# Altium footprint library WE Inductors.PcbLib: 131 footprints (part 1 of 9)
Each footprint in its own frame and in the unit in brackets; x right, y up, seen from the top. Pads: shape width x height; smd on the part's side, far side on the other; paste and mask are expansions set on the pad; w line width, h text height; cw(c..) or ccw(c..) is an arc to the next point about the centre after c.
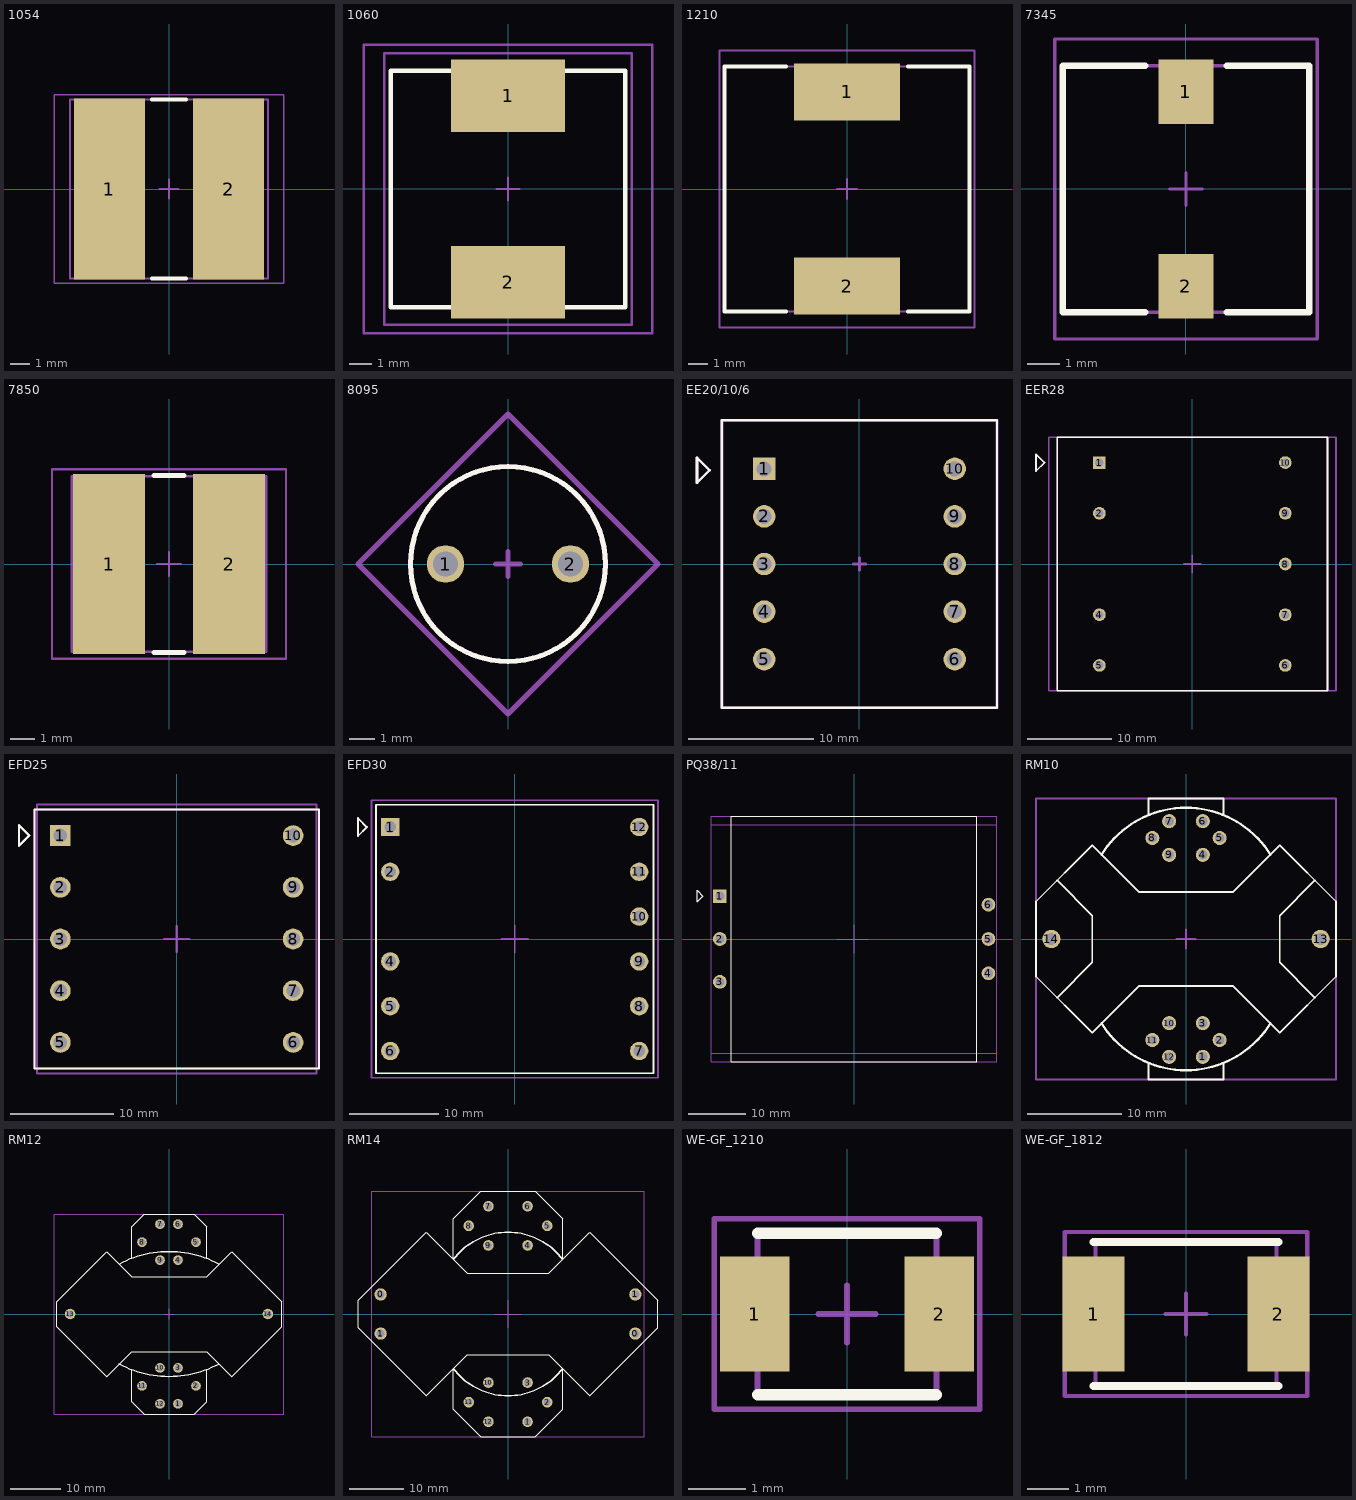
[diagram p0: the footprints below, top view; thin cyan lines are the x and y axes]

## 1054 [mm] "Precision Wire Wound Inductor, 2-Leads, Body 10.0x9.0mm, IPC Medium Density"
height 5.9
pads (2):
  rect 3.75x9.5 smd: 1(-3.125,0) 2(3.125,0)
Top Overlay:
  lines w0.2: -0.9,-4.7 0.9,-4.7 ; -0.9,4.7 0.9,4.7
Top Solder:
  rectangle: -1.27,-4.953 1.27,4.953
Mechanical 13:
  lines w0.1: -5.2,-4.7 -5.2,4.7 5.2,4.7 5.2,-4.7 -5.2,-4.7
Mechanical 15:
  lines w0.1: -0.5,0 0.5,0 ; 0,-0.5 0,0.5 ; -6.025,-4.95 -6.025,4.95 6.025,4.95 6.025,-4.95 -6.025,-4.95
3D body: height 5.4, standoff 0, extent -4.931,-4.5 4.932,4.502

## 1060 [mm] "Precision Wire Wound Inductor, 2-Leads, Body 10.0x10.0mm, IPC Medium Density"
height 6
pads (2):
  rect 5x3.2 smd: 1(0,4.1) 2(0,-4.1)
Top Overlay:
  lines w0.2: -2.5,-5.2 -5.15,-5.2 -5.15,5.2 -2.5,5.2 ; 2.5,-5.2 5.15,-5.2 5.15,5.2 2.5,5.2
Mechanical 13:
  lines w0.1: -6.35,-6.35 6.35,-6.35 6.35,6.35 -6.35,6.35 -6.35,-6.35
Mechanical 15:
  lines w0.1: -0.5,0 0.5,0 ; 0,-0.5 0,0.5 ; -5.45,-5.975 5.45,-5.975 5.45,5.975 -5.45,5.975 -5.45,-5.975
3D body: height 5.65, standoff 0, extent -6,-6 6,6

## 1210 [mm] "Precision Wire Wound Inductor, 2-Leads, Body 12.0x12.0mm, IPC Medium Density"
height 10.5
pads (2):
  rect 5.4x2.9 smd: 1(0,4.95) 2(0,-4.95)
Top Overlay:
  lines w0.2: -3.1,-6.25 -6.25,-6.25 -6.25,6.25 -3.1,6.25 ; 3.1,-6.25 6.25,-6.25 6.25,6.25 3.1,6.25
Mechanical 13:
  lines w0.1: -6.25,-6.25 -6.25,6.25 6.25,6.25 6.25,-6.25 -6.25,-6.25
Mechanical 15:
  lines w0.1: -0.5,0 0.5,0 ; 0,-0.5 0,0.5 ; -6.5,-7.075 -6.5,7.075 6.5,7.075 6.5,-7.075 -6.5,-7.075
3D body: height 9.7, standoff 0, extent -6,-6 6,6

## 7345 [mm] "Precision Wire Wound Inductor, 2-Leads, Body 7.3x7.3mm, IPC Medium Density"
height 4.5
pads (2):
  rect 1.7x2 smd: 1(0,3) 2(0,-3)
Top Overlay:
  lines w0.2: -1.25,-3.8 -3.8,-3.8 -3.8,3.8 -1.25,3.8 ; 1.25,-3.8 3.8,-3.8 3.8,3.8 1.25,3.8
Mechanical 13:
  lines w0.1: -3.8,-3.8 -3.8,3.8 3.8,3.8 3.8,-3.8 -3.8,-3.8
Mechanical 15:
  lines w0.1: -0.5,0 0.5,0 ; 0,-0.5 0,0.5 ; -4.05,-4.625 -4.05,4.625 4.05,4.625 4.05,-4.625 -4.05,-4.625
3D body: height 4.05, standoff 0, extent -3.65,-3.65 3.65,3.65

## 7850 [mm] "Precision Wire Wound Inductor, 2-Leads, Body 7.8x7.0mm, IPC Medium Density"
height 5.5
pads (2):
  rect 3x7.5 smd: 1(-2.5,0) 2(2.5,0)
Top Overlay:
  lines w0.2: -0.635,-3.683 0.635,-3.683 ; -0.635,3.683 0.635,3.683
Top Solder:
  rectangle: -1.016,-3.937 1.016,3.937
Mechanical 13:
  lines w0.1: -4.05,-3.65 -4.05,3.65 4.05,3.65 4.05,-3.65 -4.05,-3.65
Mechanical 15:
  lines w0.1: -0.5,0 0.5,0 ; 0,-0.5 0,0.5 ; -4.875,-3.95 -4.875,3.95 4.875,3.95 4.875,-3.95 -4.875,-3.95
3D body: height 4.9, standoff -0.05, extent -3.813,-3.5 3.813,3.5

## 8095 [mm] "THT, 2-PIN, Body (7.8 X7.8 mm),pitch 5mm"
height 9.5
pads (2):
  round 1.5 hole 1 paste+0: 1(-2.5,0) 2(2.5,0)
Top Overlay:
  circle w0.2: c0,0 r3.9
Mechanical 13:
  lines w0.2: -6,0 0,6 6,0 0,-6 -6,0
Mechanical 15:
  circle w0.2: c0,0 r3.9
  lines w0.2: -0.5,0 0.5,0 ; 0,-0.5 0,0.5
3D body: height 9.5, standoff -5, extent -5.515,-5.515 5.515,5.515

## EE20/10/6 [mm] "THT-10pin- Body 22x32mm ,3.81mm pitch"
height 17.5
pads (10):
  rect 1.8x1.8 hole 1.2: 1(-7.62,7.62)
  round 1.8 hole 1.2: 2(-7.62,3.81) 3(-7.62,0) 4(-7.62,-3.81) 5(-7.62,-7.62) 6(7.62,-7.62) 7(7.62,-3.81) 8(7.62,0) 9(7.62,3.81) 10(7.62,7.62)
Top Overlay:
  lines w0.2: -11,-11.5 -11,11.5 11,11.5 11,-11.5 -11,-11.5
  lines w0.203: -13,8.5 -13,8.5 ; -13,8.5 -12,7.5 -13,6.5 -13,8.5
Mechanical 13:
  lines w0.203: -13,6.5 -13,8.5 -12,7.5 -13,6.5 ; -11,-11.5 11,-11.5 11,11.5 -11,11.5 -11,-11.5
Mechanical 15:
  lines w0.203: -0.5,0 0.5,0 ; 0,-0.5 0,0.5 ; -11,-11.5 11,-11.5 11,11.5 -11,11.5 -11,-11.5
3D body: height 16.95, standoff -3.5, extent -10.55,-11 10.55,11

## EER28 [mm] "THT-10pin- Body 33x32mm ,6mm pitch"
height 23
pads (9):
  rect 1.5x1.5 hole 1: 1(-11,12)
  round 1.5 hole 1: 2(-11,6) 4(-11,-6) 5(-11,-12) 6(11,-12) 7(11,-6) 8(11,0) 9(11,6) 10(11,12)
Top Overlay:
  lines w0.2: -16,-15 16,-15 16,15 -16,15 -16,-15
  lines w0.203: -18.5,13 -18.5,11 -17.5,12 -18.5,13 ; -18.5,13 -18.5,13
Mechanical 13:
  lines w0.203: -18.5,11 -17.5,12 -18.5,13 -18.5,11 ; -17,-15 17,-15 17,15 -17,15 -17,-15
Mechanical 15:
  lines w0.203: -1,0 1,0 ; 0,-1 0,1 ; -16,-15 16,-15 16,15 -16,15 -16,-15
3D body: height 21.4, standoff -3.95, extent -16.5,-14.5 16.5,14.5

## EFD25 [mm] "THT-10pin- Body 25.81x25mm ,5mm pitch"
height 13.1
pads (10):
  rect 2x2 hole 1.32: 1(-11.25,10)
  round 2 hole 1.32: 2(-11.25,5) 3(-11.25,0) 4(-11.25,-5) 5(-11.25,-10) 6(11.25,-10) 7(11.25,-5) 8(11.25,0) 9(11.25,5) 10(11.25,10)
Top Overlay:
  lines w0.2: -13.75,-12.5 -13.75,12.5 1.25,12.5 13.75,12.5 13.75,-12.5 -13.75,-12.5
  lines w0.203: -15.25,11 -15.25,11 ; -15.25,11 -14.25,10 -15.25,9 -15.25,11
Mechanical 13:
  lines w0.203: -15.25,9 -15.25,11 -14.25,10 -15.25,9 ; -13.5,-13 13.5,-13 13.5,13 -13.5,13 -13.5,-13
Mechanical 15:
  lines w0.203: -1.25,0 1,0 1.25,0 ; 0,-1.25 0,1.25 ; -13.75,-12.5 -13.75,12.5 13.75,12.5 13.75,-12.5 -13.75,-12.5
3D body: height 12.8, standoff -3.8, extent -12.905,-12.5 12.905,12.5

## EFD30 [mm] "THT-12pin- Body 31x30mm ,5mm pitch"
height 14
pads (11):
  rect 2.05x2.05 hole 1.32: 1(-13.9,12.5)
  round 2.05 hole 1.32: 2(-13.9,7.5) 4(-13.9,-2.5) 5(-13.9,-7.5) 6(-13.9,-12.5) 7(13.9,-12.5) 8(13.9,-7.5) 9(13.9,-2.5) 10(13.9,2.5) 11(13.9,7.5) 12(13.9,12.5)
Top Overlay:
  lines w0.2: -15.5,-15 -15.5,15 15.5,15 15.5,-15 -15.5,-15
  lines w0.203: -17.5,13.5 -17.5,13.5 ; -17.5,13.5 -16.5,12.5 -17.5,11.5 -17.5,13.5
Mechanical 13:
  lines w0.203: -17.5,11.5 -17.5,13.5 -16.5,12.5 -17.5,11.5 ; -16,-15.5 16,-15.5 16,15.5 -16,15.5 -16,-15.5
Mechanical 15:
  lines w0.203: -1.5,0 1.5,0 ; 0,-1.5 0,1.5 ; -16,-15.5 16,-15.5 16,15.5 -16,15.5 -16,-15.5
3D body: height 11, standoff -5.8, extent -15.5,-15 15.5,15

## PQ38/11 [mm] "THT-06pin- Body 38x47mm ,6mm pitch"
height 14
pads (6):
  rect 2.4x2.4 hole 1.6: 1(-23.5,7.5)
  round 2.4 hole 1.6: 2(-23.5,0) 3(-23.5,-7.5) 4(23.5,-6) 5(23.5,0) 6(23.5,6)
Top Overlay:
  lines w0.2: -21.5,-21.5 -21.5,21.5 21.5,21.5 21.5,-21.5 -21.5,-21.5
  lines w0.203: -27.5,8.5 -27.5,8.5 ; -27.5,8.5 -26.5,7.5 -27.5,6.5 -27.5,8.5
Mechanical 13:
  lines w0.203: -27.5,6.5 -27.5,8.5 -26.5,7.5 -27.5,6.5 ; -25,-20 25,-20 25,20 -25,20 -25,-20
Mechanical 15:
  lines w0.203: -3,0 2.5,0 ; 0,-2.5 0,2.5 ; -25,-21.5 -25,21.5 25,21.5 25,-21.5 -25,-21.5
3D body: height 9.25, standoff -3.78, extent -23.9,-19 23.9,19

## RM10 [mm] "THT-12pin- Body 31x29mm ,3.59mm pitch"
height 20
pads (14):
  round 1.5 hole 1: 1(1.795,-12.57) 2(3.59,-10.775) 3(1.795,-8.98) 4(1.795,8.98) 5(3.59,10.775) 6(1.795,12.57) 7(-1.795,12.57) 8(-3.59,10.775) 9(-1.795,8.98) 10(-1.795,-8.98) 11(-3.59,-10.775) 12(-1.795,-12.57)
  round 1.95 hole 1.3: 13(14.365,0) 14(-14.365,0)
Top Overlay:
  lines w0.203: -13.75,-6.25 -10,-2.5 -10,2.5 -13.75,6.25 ; -4,-13.3 -4,-15 4,-15 4,-13.3 ; -4,13.3 -4,15 4,15 4,13.3 ; 13.75,-6.25 10,-2.5 10,2.5 13.75,6.25 ; -16,-4 -10,-10 -5,-5 5,-5 10,-10 16,-4 16,4 10,10 5,5 -5,5 -8.232,8.232 -10,10 -16,4 -16,-4
  lines w0.254: -9,-9 ccw(c0,-3.4) 9,-9 ; -9,9 cw(c0,3.4) 9,9
Mechanical 13:
  lines w0.203: -16,-15 -16,15 16,15 16,-15 -16,-15
Mechanical 15:
  lines w0.203: -1,0 1,0 ; 0,-1 0,1 ; -16,-15 16,-15 16,15 -16,15 -16,-15
3D body: height 18.6, standoff -3.59, extent -14.615,-14.1 14.615,14.1

## RM12 [mm] "THT-12pin- Body 41x40mm ,3.59mm pitch"
height 26
pads (14):
  round 1.95 hole 1.3: 1(1.8,-17.96) 2(5.4,-14.365) 3(1.8,-10.775) 4(1.8,10.775) 5(5.4,14.365) 6(1.8,17.96) 7(-1.8,17.96) 8(-5.4,14.365) 9(-1.8,10.775) 10(-1.8,-10.775) 11(-5.4,-14.365) 12(-1.8,-17.96)
  round 2.1 hole 1.4: 13(-19.785,0) 14(19.785,0)
Top Overlay:
  lines w0.203: -7.5,-11.2 -7.5,-17.5 -5,-20 5,-20 7.5,-17.5 7.5,-11.3 ; -7.5,11.1 -7.5,17.5 -5,20 5,20 7.5,17.5 7.5,11.2 ; -22.5,-2.5 -22.5,2.5 -12.5,12.5 -7.5,7.5 7.5,7.5 12.5,12.5 22.5,2.5 22.5,-2.5 12.5,-12.5 7.5,-7.5 -7.5,-7.5 -12.5,-12.5 -22.5,-2.5
  lines w0.254: -10,-10 ccw(c0,8.75) 10,-10 ; -10,10 cw(c0,-8.75) 10,10
Mechanical 13:
  lines w0.203: -23,-20 23,-20 23,20 -23,20 -23,-20
Mechanical 15:
  lines w0.203: -1,0 1,0 ; 0,-1 0,1 ; -23,-20 23,-20 23,20 -23,20 -23,-20
3D body: height 23.4, standoff -4, extent -20.015,-19.25 20.015,19.25

## RM14 [mm] "THT-12pin- Body 48x43mm ,7.18mm pitch"
height 32
pads (16):
  round 2.25 hole 1.5: 0(-23.35,3.59) 0(23.35,-3.59) 1(-23.35,-3.59) 1(23.35,3.59)
  round 1.95 hole 1.3: 1(3.59,-19.755) 2(7.185,-16.165) 3(3.59,-12.57) 4(3.59,12.57) 5(7.185,16.165) 6(3.59,19.755) 7(-3.59,19.755) 8(-7.185,16.165) 9(-3.59,12.57) 10(-3.59,-12.57) 11(-7.185,-16.165) 12(-3.59,-19.755)
Top Overlay:
  lines w0.203: -10,-10 -10,-17.5 -5,-22.5 5,-22.5 10,-17.5 10,-10 ; -10,10 -10,17.5 -5,22.5 5,22.5 10,17.5 10,10 ; -27.5,-2.5 -27.5,2.5 -15,15 -7.5,7.5 7.5,7.5 15,15 27.5,2.5 27.5,-2.5 15,-15 7.5,-7.5 -7.5,-7.5 -15,-15 -27.5,-2.5
  lines w0.254: -10,-10 ccw(c0,-2.5) 10,-10 ; -10,10 cw(c0,2.5) 10,10
Mechanical 13:
  lines w0.203: -25,-22.5 -25,22.5 25,22.5 25,-22.5 -25,-22.5
Mechanical 15:
  lines w0.203: -2.5,0 2.5,0 ; 0,-2.5 0,2.5 ; -25,-22.5 -25,22.5 25,22.5 25,-22.5 -25,-22.5
3D body: height 30.1, standoff -4, extent -23.598,-21 23.599,21

## WE-GF_1210 [mm] "Molded Inductor, 2-Leads, Body 2,9x2,5mm"
height 2.4
pads (2):
  rect 1.2x2 smd: 1(-1.6,0) 2(1.6,0)
Top Overlay:
  lines w0.2: -1.55,-1.4 1.55,-1.4 ; -1.55,1.4 1.55,1.4
Mechanical 13:
  lines w0.1: -1.55,-1.35 1.55,-1.35 1.55,1.35 -1.55,1.35 -1.55,-1.35
Mechanical 15:
  lines w0.1: -0.5,0 0.5,0 ; 0,-0.5 0,0.5 ; -2.3,-1.65 2.3,-1.65 2.3,1.65 -2.3,1.65 -2.3,-1.65
3D body: height 2.19, standoff -0.01, extent -1.6,-1.25 1.6,1.25

## WE-GF_1812 [mm] "Molded Inductor, 2-Leads, Body 4,2x3,2mm"
height 3.6
pads (2):
  rect 1.5x2.8 smd: 1(-2.25,0) 2(2.25,0)
Top Overlay:
  lines w0.2: -2.25,-1.75 2.25,-1.75 ; -2.25,1.75 2.25,1.75
Mechanical 13:
  lines w0.1: -2.2,-1.7 -2.2,1.7 2.2,1.7 2.2,-1.7 -2.2,-1.7
Mechanical 15:
  lines w0.1: -0.5,0 0.5,0 ; 0,-0.5 0,0.5 ; -2.95,-2 -2.95,2 2.95,2 2.95,-2 -2.95,-2
3D body: height 3.19, standoff -0.01, extent -2.25,-1.6 2.25,1.6